# Altium footprint library FPC_0.5.PcbLib: 24 footprints (part 2 of 2)
Each footprint in its own frame and in the unit in brackets; x right, y up, seen from the top. Pads: shape width x height; smd on the part's side, far side on the other; paste and mask are expansions set on the pad; w line width, h text height; cw(c..) or ccw(c..) is an arc to the next point about the centre after c.
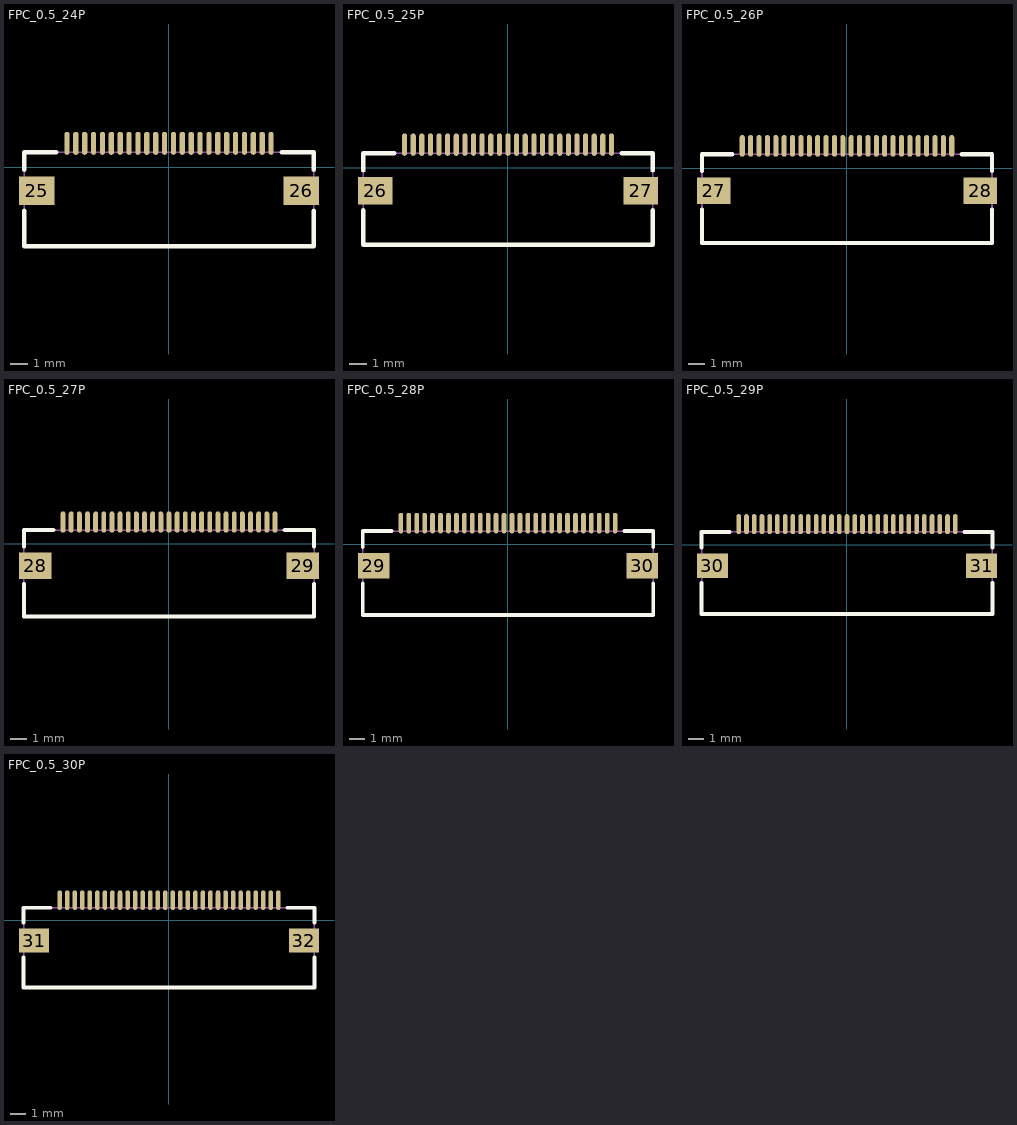
[diagram p1: the footprints below, top view; thin cyan lines are the x and y axes]

## FPC_0.5_24P [mm]
pads (26):
  oval 0.3x1.3 smd: 1(-5.75,1.34) 2(-5.25,1.34) 3(-4.75,1.34) 4(-4.25,1.34) 5(-3.75,1.34) 6(-3.25,1.34) 7(-2.75,1.34) 8(-2.25,1.34) 9(-1.75,1.34) 10(-1.25,1.34) 11(-0.75,1.34) 12(-0.25,1.34) 13(0.25,1.34) 14(0.75,1.34) 15(1.25,1.34) 16(1.75,1.34) 17(2.25,1.34) 18(2.75,1.34) 19(3.25,1.34) 20(3.75,1.34) 21(4.25,1.34) 22(4.75,1.34) 23(5.25,1.34) 24(5.75,1.34)
  rect 2x1.6 smd: 25(-7.45,-1.34) 26(7.45,-1.34)
Top Overlay:
  lines w0.25: -8.15,-2.46 -8.15,-4.46 8.15,-4.46 8.15,-2.46 ; -8.15,-0.16 -8.15,0.84 -6.35,0.84 ; 6.35,0.84 8.15,0.84 8.15,-0.16
Mechanical 15:
  lines w0.1: -8.15,-4.46 8.15,-4.46 8.15,0.84 -8.15,0.84 -8.15,-4.46
3D body "HEADER-FPC-ZIF-SMD-Horizontal-0.5-24.stp": height 2.2, standoff -0.05, extent -8.05,-4.799 8.05,1.7

## FPC_0.5_25P [mm]
pads (27):
  oval 0.3x1.3 smd: 1(-6,1.34) 2(-5.5,1.34) 3(-5,1.34) 4(-4.5,1.34) 5(-4,1.34) 6(-3.5,1.34) 7(-3,1.34) 8(-2.5,1.34) 9(-2,1.34) 10(-1.5,1.34) 11(-1,1.34) 12(-0.5,1.34) 13(0,1.34) 14(0.5,1.34) 15(1,1.34) 16(1.5,1.34) 17(2,1.34) 18(2.5,1.34) 19(3,1.34) 20(3.5,1.34) 21(4,1.34) 22(4.5,1.34) 23(5,1.34) 24(5.5,1.34) 25(6,1.34)
  rect 2x1.6 smd: 26(-7.7,-1.34) 27(7.7,-1.34)
Top Overlay:
  lines w0.25: -8.4,-2.46 -8.4,-4.46 8.4,-4.46 8.4,-2.46 ; -8.4,-0.16 -8.4,0.84 -6.6,0.84 ; 6.6,0.84 8.4,0.84 8.4,-0.16
Mechanical 15:
  lines w0.1: -8.4,-4.46 -8.4,0.84 8.4,0.84 8.4,-4.46 -8.4,-4.46
3D body "HEADER-FPC-ZIF-SMD-Horizontal-0.5-25.stp": height 2.2, standoff -0.05, extent -8.3,-4.799 8.3,1.7

## FPC_0.5_26P [mm]
pads (28):
  oval 0.3x1.3 smd: 1(-6.25,1.34) 2(-5.75,1.34) 3(-5.25,1.34) 4(-4.75,1.34) 5(-4.25,1.34) 6(-3.75,1.34) 7(-3.25,1.34) 8(-2.75,1.34) 9(-2.25,1.34) 10(-1.75,1.34) 11(-1.25,1.34) 12(-0.75,1.34) 13(-0.25,1.34) 14(0.25,1.34) 15(0.75,1.34) 16(1.25,1.34) 17(1.75,1.34) 18(2.25,1.34) 19(2.75,1.34) 20(3.25,1.34) 21(3.75,1.34) 22(4.25,1.34) 23(4.75,1.34) 24(5.25,1.34) 25(5.75,1.34) 26(6.25,1.34)
  rect 2x1.6 smd: 27(-7.95,-1.34) 28(7.95,-1.34)
Top Overlay:
  lines w0.25: -8.65,-2.46 -8.65,-4.46 8.65,-4.46 8.65,-2.46 ; -8.65,-0.16 -8.65,0.84 -6.85,0.84 ; 6.85,0.84 8.65,0.84 8.65,-0.16
Mechanical 15:
  lines w0.1: -8.65,-4.46 8.65,-4.46 8.65,0.84 -8.65,0.84 -8.65,-4.46
3D body "HEADER-FPC-ZIF-SMD-Horizontal-0.5-26.stp": height 2.2, standoff -0.05, extent -8.55,-4.799 8.55,1.7

## FPC_0.5_27P [mm]
pads (29):
  oval 0.3x1.3 smd: 1(-6.5,1.34) 2(-6,1.34) 3(-5.5,1.34) 4(-5,1.34) 5(-4.5,1.34) 6(-4,1.34) 7(-3.5,1.34) 8(-3,1.34) 9(-2.5,1.34) 10(-2,1.34) 11(-1.5,1.34) 12(-1,1.34) 13(-0.5,1.34) 14(0,1.34) 15(0.5,1.34) 16(1,1.34) 17(1.5,1.34) 18(2,1.34) 19(2.5,1.34) 20(3,1.34) 21(3.5,1.34) 22(4,1.34) 23(4.5,1.34) 24(5,1.34) 25(5.5,1.34) 26(6,1.34) 27(6.5,1.34)
  rect 2x1.6 smd: 28(-8.2,-1.34) 29(8.2,-1.34)
Top Overlay:
  lines w0.25: -8.9,-2.46 -8.9,-4.46 8.9,-4.46 8.9,-2.46 ; -8.9,-0.16 -8.9,0.84 -7.1,0.84 ; 7.1,0.84 8.9,0.84 8.9,-0.16
Mechanical 15:
  lines w0.1: -8.9,-4.46 -8.9,0.84 8.9,0.84 8.9,-4.46 -8.9,-4.46
3D body "HEADER-FPC-ZIF-SMD-Horizontal-0.5-27.stp": height 2.2, standoff -0.05, extent -8.8,-4.799 8.8,1.7

## FPC_0.5_28P [mm]
pads (30):
  oval 0.3x1.3 smd: 1(-6.75,1.34) 2(-6.25,1.34) 3(-5.75,1.34) 4(-5.25,1.34) 5(-4.75,1.34) 6(-4.25,1.34) 7(-3.75,1.34) 8(-3.25,1.34) 9(-2.75,1.34) 10(-2.25,1.34) 11(-1.75,1.34) 12(-1.25,1.34) 13(-0.75,1.34) 14(-0.25,1.34) 15(0.25,1.34) 16(0.75,1.34) 17(1.25,1.34) 18(1.75,1.34) 19(2.25,1.34) 20(2.75,1.34) 21(3.25,1.34) 22(3.75,1.34) 23(4.25,1.34) 24(4.75,1.34) 25(5.25,1.34) 26(5.75,1.34) 27(6.25,1.34) 28(6.75,1.34)
  rect 2x1.6 smd: 29(-8.45,-1.34) 30(8.45,-1.34)
Top Overlay:
  lines w0.25: -9.15,-2.46 -9.15,-4.46 9.15,-4.46 9.15,-2.46 ; -9.15,-0.16 -9.15,0.84 -7.35,0.84 ; 7.35,0.84 9.15,0.84 9.15,-0.16
Mechanical 15:
  lines w0.1: -9.15,-4.46 9.15,-4.46 9.15,0.84 -9.15,0.84 -9.15,-4.46
3D body "HEADER-FPC-ZIF-SMD-Horizontal-0.5-28.stp": height 2.2, standoff -0.05, extent -9.05,-4.799 9.05,1.7

## FPC_0.5_29P [mm]
pads (31):
  oval 0.3x1.3 smd: 1(-7,1.34) 2(-6.5,1.34) 3(-6,1.34) 4(-5.5,1.34) 5(-5,1.34) 6(-4.5,1.34) 7(-4,1.34) 8(-3.5,1.34) 9(-3,1.34) 10(-2.5,1.34) 11(-2,1.34) 12(-1.5,1.34) 13(-1,1.34) 14(-0.5,1.34) 15(0,1.34) 16(0.5,1.34) 17(1,1.34) 18(1.5,1.34) 19(2,1.34) 20(2.5,1.34) 21(3,1.34) 22(3.5,1.34) 23(4,1.34) 24(4.5,1.34) 25(5,1.34) 26(5.5,1.34) 27(6,1.34) 28(6.5,1.34) 29(7,1.34)
  rect 2x1.6 smd: 30(-8.7,-1.34) 31(8.7,-1.34)
Top Overlay:
  lines w0.25: -9.4,-2.46 -9.4,-4.46 9.4,-4.46 9.4,-2.46 ; -9.4,-0.16 -9.4,0.84 -7.6,0.84 ; 7.6,0.84 9.4,0.84 9.4,-0.16
Mechanical 15:
  lines w0.1: -9.4,-4.46 -9.4,0.84 9.4,0.84 9.4,-4.46 -9.4,-4.46
3D body "HEADER-FPC-ZIF-SMD-Horizontal-0.5-29.stp": height 2.2, standoff -0.05, extent -9.3,-4.799 9.3,1.7

## FPC_0.5_30P [mm]
pads (32):
  oval 0.3x1.3 smd: 1(-7.25,1.34) 2(-6.75,1.34) 3(-6.25,1.34) 4(-5.75,1.34) 5(-5.25,1.34) 6(-4.75,1.34) 7(-4.25,1.34) 8(-3.75,1.34) 9(-3.25,1.34) 10(-2.75,1.34) 11(-2.25,1.34) 12(-1.75,1.34) 13(-1.25,1.34) 14(-0.75,1.34) 15(-0.25,1.34) 16(0.25,1.34) 17(0.75,1.34) 18(1.25,1.34) 19(1.75,1.34) 20(2.25,1.34) 21(2.75,1.34) 22(3.25,1.34) 23(3.75,1.34) 24(4.25,1.34) 25(4.75,1.34) 26(5.25,1.34) 27(5.75,1.34) 28(6.25,1.34) 29(6.75,1.34) 30(7.25,1.34)
  rect 2x1.6 smd: 31(-8.95,-1.34) 32(8.95,-1.34)
Top Overlay:
  lines w0.25: -9.65,-2.46 -9.65,-4.46 9.65,-4.46 9.65,-2.46 ; -9.65,-0.16 -9.65,0.84 -7.85,0.84 ; 7.85,0.84 9.65,0.84 9.65,-0.16
Mechanical 15:
  lines w0.1: -9.65,-4.46 -9.65,0.84 9.65,0.84 9.65,-4.46 -9.65,-4.46
3D body "HEADER-FPC-ZIF-SMD-Horizontal-0.5-30.stp": height 2.2, standoff -0.05, extent -9.55,-4.799 9.55,1.7

## PCBComponent_1 [mm]